# Altium footprint library lib_datalogger.PcbLib: 866 footprints (part 20 of 55)
Each footprint in its own frame and in the unit in brackets; x right, y up, seen from the top. Pads: shape width x height; smd on the part's side, far side on the other; paste and mask are expansions set on the pad; w line width, h text height; cw(c..) or ccw(c..) is an arc to the next point about the centre after c.
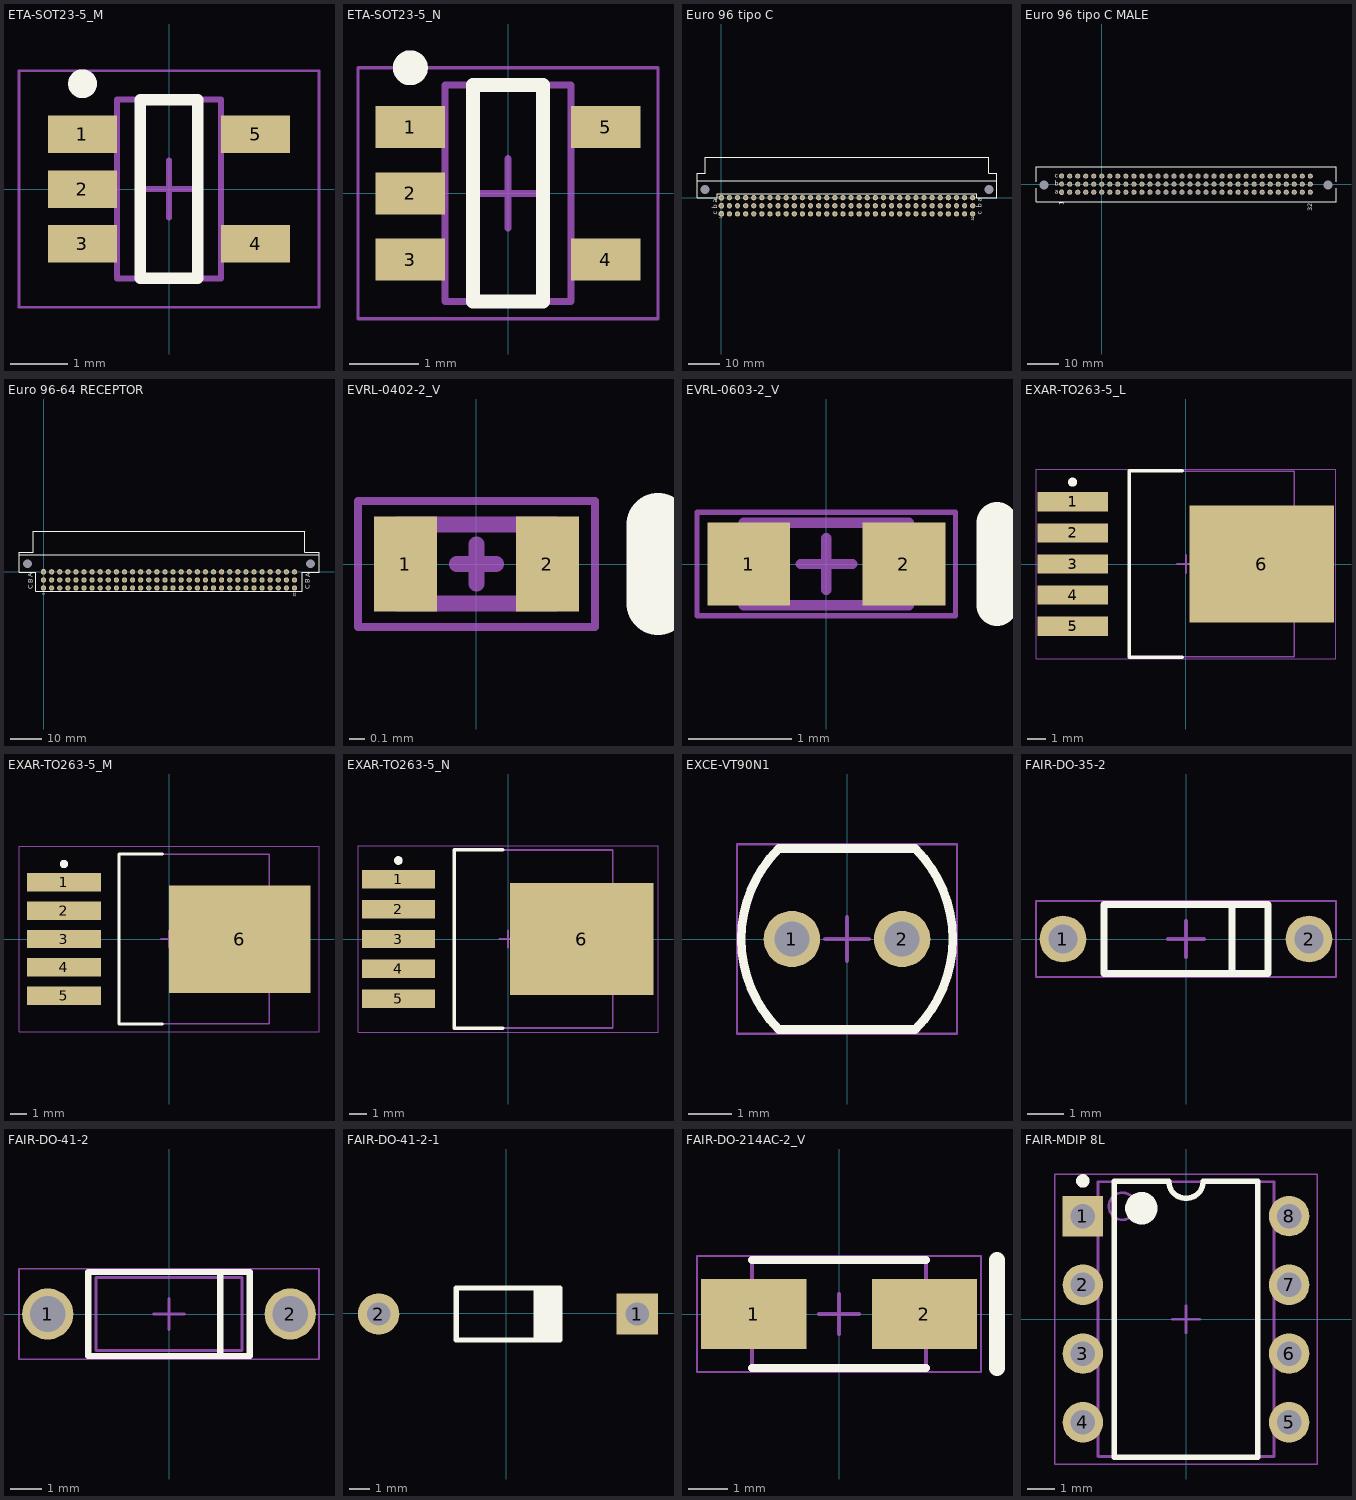
[diagram p19: the footprints below, top view; thin cyan lines are the x and y axes]

## ETA-SOT23-5_M [mm] "SOT23, 5-Leads, Body 3.1x1.8mm, Pitch 0.95mm, IPC Low Density"
height 1.36
pads (5):
  rect 1.2x0.65 smd: 1(-1.5,0.95) 2(-1.5,0) 3(-1.5,-0.95) 4(1.5,-0.95) 5(1.5,0.95)
Top Overlay:
  circle w0.25: c-1.5,1.825 r0.125
  lines w0.2: -0.5,-1.55 -0.5,1.55 0.5,1.55 0.5,-1.55 -0.5,-1.55
Mechanical 13:
  lines w0.1: -0.9,-1.55 0.9,-1.55 0.9,1.55 -0.9,1.55 -0.9,-1.55
Mechanical 15:
  lines w0.05: -2.6,-2.05 2.6,-2.05 2.6,2.05 -2.6,2.05 -2.6,-2.05
  lines w0.1: -0.5,0 0.5,0 ; 0,-0.5 0,0.5
3D body "SOT95P280X136-5M.step": height 1.36, standoff 0, extent -1.55,-1.55 1.55,1.55

## ETA-SOT23-5_N [mm] "SOT23, 5-Leads, Body 3.1x1.8mm, Pitch 0.95mm, IPC Medium Density"
height 1.36
pads (5):
  rect 1x0.6 smd: 1(-1.4,0.95) 2(-1.4,0) 3(-1.4,-0.95) 4(1.4,-0.95) 5(1.4,0.95)
Top Overlay:
  circle w0.25: c-1.4,1.8 r0.125
  lines w0.2: -0.5,-1.55 -0.5,1.55 0.5,1.55 0.5,-1.55 -0.5,-1.55
Mechanical 13:
  lines w0.1: -0.9,-1.55 0.9,-1.55 0.9,1.55 -0.9,1.55 -0.9,-1.55
Mechanical 15:
  lines w0.05: -2.15,-1.8 2.15,-1.8 2.15,1.8 -2.15,1.8 -2.15,-1.8
  lines w0.1: -0.5,0 0.5,0 ; 0,-0.5 0,0.5
3D body "SOT95P280X136-5N.step": height 1.36, standoff 0, extent -1.55,-1.55 1.55,1.55

## Euro 96 tipo C [mil]
height 23.62
pads (98):
  oct 65x65 hole 38: A1(0,0) B1(0,-100) C1(0,-200)
  round 65 hole 37: A2(100,0) B2(100,-100) C2(100,-200)
  round 65 hole 38: A3(200,0) A4(300,0) A5(400,0) A6(500,0) A7(600,0) A8(700,0) A9(800,0) A10(900,0) A11(1000,0) A12(1100,0) A13(1200,0) A14(1300,0) A15(1400,0) A16(1500,0) A17(1600,0) A18(1700,0) A19(1800,0) A20(1900,0) A21(2000,0) A22(2100,0) A23(2200,0) A24(2300,0) A25(2400,0) A26(2500,0) A27(2600,0) A28(2700,0) A29(2800,0) A30(2900,0) A31(3000,0) A32(3100,0) B3(200,-100) B4(300,-100) B5(400,-100) B6(500,-100) B7(600,-100) B8(700,-100) B9(800,-100) B10(900,-100) B11(1000,-100) B12(1100,-100) B13(1200,-100) B14(1300,-100) B15(1400,-100) B16(1500,-100) B17(1600,-100) B18(1700,-100) B19(1800,-100) B20(1900,-100) B21(2000,-100) B22(2100,-100) B23(2200,-100) B24(2300,-100) B25(2400,-100) B26(2500,-100) B27(2600,-100) B28(2700,-100) B29(2800,-100) B30(2900,-100) B31(3000,-100) B32(3100,-100) C3(200,-200) C4(300,-200) C5(400,-200) C6(500,-200) C7(600,-200) C8(700,-200) C9(800,-200) C10(900,-200) C11(1000,-200) C12(1100,-200) C13(1200,-200) C14(1300,-200) C15(1400,-200) C16(1500,-200) C17(1600,-200) C18(1700,-200) C19(1800,-200) C20(1900,-200) C21(2000,-200) C22(2100,-200) C23(2200,-200) C24(2300,-200) C25(2400,-200) C26(2500,-200) C27(2600,-200) C28(2700,-200) C29(2800,-200) C30(2900,-200) C31(3000,-200) C32(3100,-200)
  round 0 hole 110: HOLE(-200,100) HOLE(3300,100)
Top Overlay:
  lines w10: -300,210 3400,210 ; -300,0 -300,300 -200,300 -200,500 3300,500 3300,300 3400,300 3400,0 3150,0 3150,50 -50,50 -50,0 -300,0
  text "1" at 11.18,-262.31 h30
  text "32" at 3117.18,-286.31 h30
  text "a" at 3212.5,-50 h60
  text "b" at 3212.5,-125 h60
  text "c" at 3212.5,-212.5 h60
  text "a" at -50,-62.5 h60
  text "b" at -50,-137.5 h60
  text "c" at -50,-212.5 h60
3D body "c-5536356-5-o-3d.stp": height 437.01, standoff -49.8, extent -297.44,-210.53 3397.44,499

## Euro 96 tipo C MALE [mil]
height 629.92
pads (98):
  oct 64x64 hole 46: A1(-500,-100) B1(-500,0) C1(-500,100)
  round 64 hole 46: A2(-400,-100) A3(-300,-100) A4(-200,-100) A5(-100,-100) A6(0,-100) A7(100,-100) A8(200,-100) A9(300,-100) A10(400,-100) A11(500,-100) A12(600,-100) A13(700,-100) A14(800,-100) A15(900,-100) A16(1000,-100) A17(1100,-100) A18(1200,-100) A19(1300,-100) A20(1400,-100) A21(1500,-100) A22(1600,-100) A23(1700,-100) A24(1800,-100) A25(1900,-100) A26(2000,-100) A27(2100,-100) A28(2200,-100) A29(2300,-100) A30(2400,-100) A31(2500,-100) A32(2600,-100) B2(-400,0) B3(-300,0) B4(-200,0) B5(-100,0) B6(0,0) B7(100,0) B8(200,0) B9(300,0) B10(400,0) B11(500,0) B12(600,0) B13(700,0) B14(800,0) B15(900,0) B16(1000,0) B17(1100,0) B18(1200,0) B19(1300,0) B20(1400,0) B21(1500,0) B22(1600,0) B23(1700,0) B24(1800,0) B25(1900,0) B26(2000,0) B27(2100,0) B28(2200,0) B29(2300,0) B30(2400,0) B31(2500,0) B32(2600,0) C2(-400,100) C3(-300,100) C4(-200,100) C5(-100,100) C6(0,100) C7(100,100) C8(200,100) C9(300,100) C10(400,100) C11(500,100) C12(600,100) C13(700,100) C14(800,100) C15(900,100) C16(1000,100) C17(1100,100) C18(1200,100) C19(1300,100) C20(1400,100) C21(1500,100) C22(1600,100) C23(1700,100) C24(1800,100) C25(1900,100) C26(2000,100) C27(2100,100) C28(2200,100) C29(2300,100) C30(2400,100) C31(2500,100) C32(2600,100)
  round 0 hole 110: HOLE(-721.65,-11.81) HOLE(2821.65,-11.81)
Top Overlay:
  lines w7.87: -820.08,-51.18 -820.08,-218.5 2920.08,-218.5 2920.08,-51.18 ; -820.08,27.56 -820.08,218.5 2920.08,218.5 2920.08,27.56
  text "c" at -587.01,80.31 h59.06
  text "b" at -587.01,-19.68 h59.06
  text "a" at -587.01,-119.69 h59.06
  text "1" at -475,-260 h59.06
  text "32" at 2625,-338.71 h59.06
3D body "euro-96-macho.stp": height 452.76, standoff -250.2, extent -817.52,-216.54 2917.52,216.53

## Euro 96-64 RECEPTOR [mil]
height 23.62
pads (98):
  oct 65x65 hole 38: A1(0,0) B1(0,-100) C1(0,-200)
  round 65 hole 37: A2(100,0) B2(100,-100) C2(100,-200)
  round 65 hole 38: A3(200,0) A4(300,0) A5(400,0) A6(500,0) A7(600,0) A8(700,0) A9(800,0) A10(900,0) A11(1000,0) A12(1100,0) A13(1200,0) A14(1300,0) A15(1400,0) A16(1500,0) A17(1600,0) A18(1700,0) A19(1800,0) A20(1900,0) A21(2000,0) A22(2100,0) A23(2200,0) A24(2300,0) A25(2400,0) A26(2500,0) A27(2600,0) A28(2700,0) A29(2800,0) A30(2900,0) A31(3000,0) A32(3100,0) B3(200,-100) B4(300,-100) B5(400,-100) B6(500,-100) B7(600,-100) B8(700,-100) B9(800,-100) B10(900,-100) B11(1000,-100) B12(1100,-100) B13(1200,-100) B14(1300,-100) B15(1400,-100) B16(1500,-100) B17(1600,-100) B18(1700,-100) B19(1800,-100) B20(1900,-100) B21(2000,-100) B22(2100,-100) B23(2200,-100) B24(2300,-100) B25(2400,-100) B26(2500,-100) B27(2600,-100) B28(2700,-100) B29(2800,-100) B30(2900,-100) B31(3000,-100) B32(3100,-100) C3(200,-200) C4(300,-200) C5(400,-200) C6(500,-200) C7(600,-200) C8(700,-200) C9(800,-200) C10(900,-200) C11(1000,-200) C12(1100,-200) C13(1200,-200) C14(1300,-200) C15(1400,-200) C16(1500,-200) C17(1600,-200) C18(1700,-200) C19(1800,-200) C20(1900,-200) C21(2000,-200) C22(2100,-200) C23(2200,-200) C24(2300,-200) C25(2400,-200) C26(2500,-200) C27(2600,-200) C28(2700,-200) C29(2800,-200) C30(2900,-200) C31(3000,-200) C32(3100,-200)
  round 0 hole 110: HOLE(-200,100) HOLE(3300,100)
Top Overlay:
  lines w10: -300,210 3403,210 ; -303,-7 -303,245 -126,245 -126,500 3226,500 3226,245 3403,245 3403,-7 3195,-7 3195,-242 -95,-242 -95,-7 -303,-7
  text "C" at 3236,-216.35 h60
  text "B" at 3236,-141.92 h60
  text "A" at 3295.99,-67.5 h60
  text "1" at 13,-286.22 h30
  text "32" at 3117,-306 h30
  text "A" at -136,-67.5 h60
  text "B" at -136,-141.92 h60
  text "C" at -136,-216.35 h60
3D body "c-5650897-04-o-3d.stp": height 364.17, standoff -109.25, extent -300,-225.83 3400,497

## EVRL-0402-2_V [mm] "SMD, 2-Leads, Body 1x0.5mm"
height 0.25
pads (2):
  rect 0.4x0.6 smd: 1(-0.45,0) 2(0.45,0)
Top Overlay:
  lines w0.4: 1.15,-0.25 1.15,0.25
Mechanical 13:
  lines w0.1: -0.5,-0.25 -0.5,0.25 0.5,0.25 0.5,-0.25 -0.5,-0.25
Mechanical 15:
  lines w0.05: -0.75,-0.4 -0.75,0.4 0.75,0.4 0.75,-0.4 -0.75,-0.4
  lines w0.1: -0.125,0 0.125,0 ; 0,-0.125 0,0.125
3D body: height 0.25, standoff 0, extent -0.5,-0.25 0.5,0.25

## EVRL-0603-2_V [mm] "SMD, 2-Leads, Body 1.6x0.8mm"
height 0.5
pads (2):
  rect 0.8x0.8 smd: 1(-0.75,0) 2(0.75,0)
Top Overlay:
  lines w0.4: 1.65,-0.4 1.65,0.4
Mechanical 13:
  lines w0.1: -0.8,-0.4 -0.8,0.4 0.8,0.4 0.8,-0.4 -0.8,-0.4
Mechanical 15:
  lines w0.05: -1.25,-0.5 -1.25,0.5 1.25,0.5 1.25,-0.5 -1.25,-0.5
  lines w0.1: -0.25,0 0.25,0 ; 0,-0.25 0,0.25
3D body: height 0.5, standoff 0, extent -0.5,-0.4 0.5,0.4
3D body: height 0.15, standoff 0, extent -0.8,-0.4 0.8,0.4

## EXAR-TO263-5_L [mm] "D2-PAK, 6-Pads, Body 9.02x10.15mm, IPC High Density"
height 4.83
pads (6):
  rect 3.85x1.05 smd: 1(-6.2,3.4) 2(-6.2,1.7) 3(-6.2,0) 4(-6.2,-1.7) 5(-6.2,-3.4)
  rect 7.9x6.4 smd: 6(4.15,0)
Top Overlay:
  circle w0.25: c-6.2,4.475 r0.125
  lines w0.2: -0.2,-5.1 -3.1,-5.1 -3.1,5.1 -0.2,5.1
Mechanical 13:
  lines w0.1: -3.1,-5.075 -3.1,5.075 5.92,5.075 5.92,-5.075 -3.1,-5.075
Mechanical 15:
  lines w0.05: -8.2,-5.175 -8.2,5.175 8.2,5.175 8.2,-5.175 -8.2,-5.175
  lines w0.1: -0.5,0 0.5,0 ; 0,-0.5 0,0.5
3D body "DPAK170P1525X483-6M.step": height 4.83, standoff 0, extent -6.55,-5.075 8.695,5.075

## EXAR-TO263-5_M [mm] "D2-PAK, 6-Pads, Body 9.02x10.15mm, IPC Low Density"
height 4.83
pads (6):
  rect 4.45x1.1 smd: 1(-6.3,3.4) 2(-6.3,1.7) 3(-6.3,0) 4(-6.3,-1.7) 5(-6.3,-3.4)
  rect 8.5x6.45 smd: 6(4.25,0)
Top Overlay:
  circle w0.25: c-6.3,4.5 r0.125
  lines w0.2: -0.4,-5.1 -3,-5.1 -3,5.1 -0.4,5.1
Mechanical 13:
  lines w0.1: -3,-5.075 -3,5.075 6.02,5.075 6.02,-5.075 -3,-5.075
Mechanical 15:
  lines w0.05: -9,-5.575 -9,5.575 9,5.575 9,-5.575 -9,-5.575
  lines w0.1: -0.5,0 0.5,0 ; 0,-0.5 0,0.5
3D body "DPAK170P1525X483-6M.step": height 4.83, standoff 0, extent -6.65,-5.075 8.595,5.075

## EXAR-TO263-5_N [mm] "D2-PAK, 6-Pads, Body 9.02x10.15mm, IPC Medium Density"
height 4.83
pads (6):
  rect 4.15x1.05 smd: 1(-6.25,3.4) 2(-6.25,1.7) 3(-6.25,0) 4(-6.25,-1.7) 5(-6.25,-3.4)
  rect 8.2x6.4 smd: 6(4.2,0)
Top Overlay:
  circle w0.25: c-6.25,4.475 r0.125
  lines w0.2: -0.3,-5.1 -3.05,-5.1 -3.05,5.1 -0.3,5.1
Mechanical 13:
  lines w0.1: -3.05,-5.075 -3.05,5.075 5.97,5.075 5.97,-5.075 -3.05,-5.075
Mechanical 15:
  lines w0.05: -8.55,-5.325 -8.55,5.325 8.55,5.325 8.55,-5.325 -8.55,-5.325
  lines w0.1: -0.5,0 0.5,0 ; 0,-0.5 0,0.5
3D body "DPAK170P1525X483-6M.step": height 4.83, standoff 0, extent -6.6,-5.075 8.645,5.075

## EXCE-VT90N1 [mm] "THD, 2-Leads, Body Width 4.17mm (Max), Height 2.29mm"
height 2.29
pads (2):
  round 1.3 hole 0.8: 1(-1.27,0) 2(1.27,0)
Top Overlay:
  lines w0.2: -1.575,-2.085 cw(c0.51,0) -1.575,2.085 1.575,2.085 cw(c-0.51,0) 1.575,-2.085 -1.575,-2.085
Mechanical 13:
  lines w0.1: -1.575,-2.085 cw(c0.51,0) -1.575,2.085 1.575,2.085 cw(c-0.51,0) 1.575,-2.085 -1.575,-2.085
Mechanical 15:
  lines w0.05: -2.54,-2.185 2.54,-2.185 2.54,2.185 -2.54,2.185 -2.54,-2.185
  lines w0.1: -0.5,0 0.5,0 ; 0,-0.5 0,0.5
3D body: height 2.29, standoff 0, extent -2.439,-2.086 2.439,2.086

## FAIR-DO-35-2 [mm] "TH, 2-Leads, Dia 1.91mm"
height 1.91
pads (2):
  round 1.3 hole 0.8: 1(-3.42,0) 2(3.42,0)
Top Overlay:
  lines w0.2: 1.28,-0.955 1.28,0.955 ; -2.28,-0.955 -2.28,0.955 2.28,0.955 2.28,-0.955 -2.28,-0.955
Mechanical 13:
  lines w0.1: -2.28,-0.955 2.28,-0.955 2.28,0.955 -2.28,0.955 -2.28,-0.955
Mechanical 15:
  lines w0.05: -4.17,-1.055 4.17,-1.055 4.17,1.055 -4.17,1.055 -4.17,-1.055
  lines w0.1: -0.5,0 0.5,0 ; 0,-0.5 0,0.5
3D body: height 0.95, standoff -2, extent 3.162,-0.267 3.696,0.267
3D body: height 1.22, standoff 0.69, extent 3.162,-0.267 3.696,0.267
3D body: height 1.22, standoff 0.69, extent 2.289,-0.267 3.429,0.267
3D body: height 1.22, standoff 0.69, extent -3.429,-0.267 -2.289,0.267
3D body: height 1.22, standoff 0.69, extent -3.696,-0.267 -3.162,0.267
3D body: height 0.95, standoff -2, extent -3.696,-0.266 -3.162,0.267
3D body: height 1.91, standoff 0, extent -2.28,-0.955 2.28,0.955

## FAIR-DO-41-2 [mm] "THD, 2-Leads, Body 5.2x2.72mm, Pin Spacing 7.8mm"
height 2.72
pads (2):
  round 1.65 hole 1.15: 1(-3.9,0) 2(3.9,0)
Top Overlay:
  lines w0.2: 1.651,-1.35 1.651,1.35 ; -2.6,-1.35 2.6,-1.35 2.6,1.35 -2.6,1.35 -2.6,-1.35
Mechanical 13:
  lines w0.1: -2.35,-1.174 2.35,-1.174 2.35,1.174 -2.35,1.174 -2.35,-1.174
Mechanical 15:
  lines w0.05: -4.825,-1.45 4.825,-1.45 4.825,1.45 -4.825,1.45 -4.825,-1.45
  lines w0.1: -0.5,0 0.5,0 ; 0,-0.5 0,0.5
3D body: height 2.35, standoff 0, extent -2.35,-1.174 2.35,1.174
3D body: height 1.57, standoff 0.78, extent 2.35,-0.392 3.9,0.392
3D body: height 1.17, standoff -2, extent 3.507,-0.392 4.292,0.393
3D body: height 1.57, standoff 0.78, extent 3.508,-0.392 4.292,0.393
3D body: height 1.57, standoff 0.78, extent -4.292,-0.392 -3.507,0.392
3D body: height 1.17, standoff -2, extent -4.292,-0.392 -3.507,0.393
3D body: height 1.57, standoff 0.78, extent -3.899,-0.392 -2.349,0.392

## FAIR-DO-41-2-1 [mil] "THD, 2-Leads, Body 5.2x2.72mm, Pin Spacing 7.8mm"
height 107.09
pads (2):
  rect 80x80 hole 45: 1(253.09,-1.01)
  round 80 hole 45: 2(-246.91,-1.01)
Top Overlay:
  region: 53.09,48.99 53.09,-51.01 103.09,-51.01 103.09,48.99
  lines w10: -96.91,-51.01 103.09,-51.01 103.09,48.99 -96.91,48.99 -96.91,-51.01
3D body: height 92.52, standoff 0, extent -115.04,-46.24 70,46.24
3D body: height 61.71, standoff 30.81, extent 100,-15.45 257.48,15.45
3D body: height 46.26, standoff -78.74, extent 237.63,-16.45 268.53,14.45
3D body: height 61.71, standoff 30.81, extent 237.64,-16.45 268.53,14.45
3D body: height 61.71, standoff 30.81, extent -262.35,-16.46 -231.45,14.44
3D body: height 46.26, standoff -78.74, extent -262.35,-16.46 -231.44,14.45
3D body: height 61.71, standoff 30.81, extent -248.74,-15.91 -91.26,15
3D body: height 92.52, standoff 0, extent 70,-46.26 120,46.26

## FAIR-DO-214AC-2_V [mm] "DO-214, 2-Leads, Body 4.375x2.725mm"
height 2.5
pads (2):
  rect 2.65x1.75 smd: 1(-2.15,0) 2(2.15,0)
Top Overlay:
  lines w0.2: -2.187,-1.362 2.187,-1.362 ; -2.187,1.362 2.187,1.362
  lines w0.4: 3.975,-1.362 3.975,1.362
Mechanical 13:
  lines w0.1: -2.187,-1.362 -2.187,1.362 2.187,1.362 2.187,-1.362 -2.187,-1.362
Mechanical 15:
  lines w0.05: -3.575,-1.462 -3.575,1.462 3.575,1.462 3.575,-1.462 -3.575,-1.462
  lines w0.1: -0.5,0 0.5,0 ; 0,-0.5 0,0.5
3D body "DIOM4427X27M.step": height 2.7, standoff 0, extent -2.595,-1.475 2.595,1.475

## FAIR-MDIP 8L [mm] "DIP, 8-Leads, Body 9.4x6.6mm, Pitch 2.54mm"
height 5.33
pads (8):
  rect 1.5x1.5 hole 0.9: 1(-3.81,3.81)
  round 1.5 hole 0.9: 2(-3.81,1.27) 3(-3.81,-1.27) 4(-3.81,-3.81) 5(3.81,-3.81) 6(3.81,-1.27) 7(3.81,1.27) 8(3.81,3.81)
Top Overlay:
  circle w0.6: c-1.65,4.1 r0.3
  circle w0.25: c-3.81,5.11 r0.125
  lines w0.2: -2.65,-5.1 2.65,-5.1 2.65,5.1 0.635,5.1 cw(c0,5.1) -0.635,5.1 -2.65,5.1 -2.65,-5.1
Mechanical 13:
  circle w0.1: c-2.35,4.175 r0.5
  lines w0.1: -3.25,-5.075 3.25,-5.075 3.25,5.075 -3.25,5.075 -3.25,-5.075
Mechanical 15:
  lines w0.05: -4.85,-5.35 4.85,-5.35 4.85,5.35 -4.85,5.35 -4.85,-5.35
  lines w0.1: -0.5,0 0.5,0 ; 0,-0.5 0,0.5
3D body: height 5.33, standoff 0.38, extent -3.25,-5.075 3.25,5.075
3D body: height 0, standoff -1.6, extent 3.675,3.45 3.945,4.17
3D body: height 2.99, standoff 2.72, extent 3.25,3.31 3.945,4.31
3D body: height 2.72, standoff 0, extent 3.675,3.31 3.945,4.31
3D body: height 0, standoff -1.6, extent 3.675,0.91 3.945,1.63
3D body: height 2.99, standoff 2.72, extent 3.25,0.77 3.945,1.77
3D body: height 2.72, standoff 0, extent 3.675,0.77 3.945,1.77
3D body: height 0, standoff -1.6, extent 3.675,-1.63 3.945,-0.91
3D body: height 2.99, standoff 2.72, extent 3.25,-1.77 3.945,-0.77
3D body: height 2.72, standoff 0, extent 3.675,-1.77 3.945,-0.77
3D body: height 0, standoff -1.6, extent 3.675,-4.17 3.945,-3.45
3D body: height 2.99, standoff 2.72, extent 3.25,-4.31 3.945,-3.31
3D body: height 2.72, standoff 0, extent 3.675,-4.31 3.945,-3.31
3D body: height 0, standoff -1.6, extent -3.945,-4.17 -3.675,-3.45
3D body: height 2.99, standoff 2.72, extent -3.945,-4.31 -3.25,-3.31
3D body: height 2.72, standoff 0, extent -3.945,-4.31 -3.675,-3.31
3D body: height 0, standoff -1.6, extent -3.945,-1.63 -3.675,-0.91
3D body: height 2.99, standoff 2.72, extent -3.945,-1.77 -3.25,-0.77
3D body: height 2.72, standoff 0, extent -3.945,-1.77 -3.675,-0.77
3D body: height 0, standoff -1.6, extent -3.945,0.91 -3.675,1.63
3D body: height 2.99, standoff 2.72, extent -3.945,0.77 -3.25,1.77
3D body: height 2.72, standoff 0, extent -3.945,0.77 -3.675,1.77
3D body: height 0, standoff -1.6, extent -3.945,3.45 -3.675,4.17
3D body: height 2.99, standoff 2.72, extent -3.945,3.31 -3.25,4.31
3D body: height 2.72, standoff 0, extent -3.945,3.31 -3.675,4.31